# Altium footprint library Switches.PcbLib: 117 footprints (part 6 of 8) (continued)
## SW_LORLIN_CK_1-2-4-POLES [mm] "1 Pole 12 Ways, Or 2 Poles 6 Ways, Or 4 Poles 3 Ways, Rotary Switch, LORLIN CK Serie" (continued)
Mechanical 14:
  circle w0.1: c0,-9.5 r0.9
  circle w0.1: c0,-9.5 r1.1
  circle w0.1: c0,-9.5 r0.2
  circle w0.1: c0,-9.5 r0.1
  circle w0.1: c0,-9.5 r0.5
  circle w0.1: c0,-9.5 r1.3
  circle w0.1: c0,-9.5 r0.7
  circle w0.1: c0,-9.5 r0.3
  circle w0.1: c0,0 r3
  circle w0.1: c0,0 r4.8
  circle w0.1: c0,-9.5 r1.5
  circle w0.1: c0,0 r13.1
  circle w0.1: c-7.778,-7.778 r0.75
  circle w0.1: c-10.625,-2.847 r0.75
  circle w0.1: c-10.625,2.847 r0.75
  circle w0.1: c-7.778,7.778 r0.75
  circle w0.1: c-2.847,10.625 r0.75
  circle w0.1: c2.847,10.625 r0.75
  circle w0.1: c7.778,7.778 r0.75
  circle w0.1: c10.625,2.847 r0.75
  circle w0.1: c10.625,-2.847 r0.75
  circle w0.1: c7.778,-7.778 r0.75
  circle w0.1: c2.847,-10.625 r0.75
  circle w0.1: c-2.847,-10.625 r0.75
  circle w0.1: c-2.722,2.722 r0.75
  circle w0.1: c2.722,2.722 r0.75
  circle w0.1: c2.722,-2.722 r0.75
  circle w0.1: c-2.722,-2.722 r0.75
  circle w0.1: c0,-9.5 r1.5
  circle w0.1: c0,-9.5 r1.4
  circle w0.1: c0,-9.5 r1.2
  circle w0.1: c0,-9.5 r1
  circle w0.1: c0,-9.5 r0.8
  circle w0.1: c0,-9.5 r0.6
  circle w0.1: c0,-9.5 r0.4
  lines w0.1: -7.548,-10.707 ccw(c-6.249,-10.768) -5.552,-11.865 ; -7.5,10.741 cw(c-6.201,10.796) -5.499,11.89 ; -1.177,-8.57 cw(c0,0) 1.177,-8.57 ; 5.499,-11.89 ccw(c6.201,-10.796) 7.5,-10.741 ; 5.552,11.865 cw(c6.249,10.768) 7.548,10.707
  text "B" at -1.299,0.833 h1
  text "C" at 0.833,1.299 h1
  text "D" at 1.299,-0.833 h1
  text "A" at -0.833,-1.299 h1
  text "6" at -1.958,5.547 h1.5
  text "5" at -4.469,3.825 h1.5
  text "4" at -5.783,1.078 h1.5
  text "3" at -5.547,-1.958 h1.5
  text "2" at -3.825,-4.469 h1.5
  text "1" at -1.279,-5.742 h1.5
  text "12" at 2.245,-5.437 h1.5
  text "11" at 4.6,-3.666 h1.5
  text "10" at 5.831,-0.774 h1.5
  text "9" at 5.497,2.044 h1.5
  text "8" at 3.788,4.432 h1.5
  text "7" at 1.064,5.733 h1.5
3D body "SW_LORLIN_CK_1-2-4-POLES.stp": height 64.1, standoff -3.5, extent -13.1,-13.1 13.1,13.1

## SW_LORLIN_CK_3-POLES [mm] "3 Pole 4 Ways, Rotary Switch, LORLIN CK Serie"
height 68.1
pads (15):
  round 2 hole 1.5: 1(-2.847,-10.625) 2(-7.778,-7.778) 3(-10.625,-2.847) 4(-10.625,2.847) 5(-7.778,7.778) 6(-2.847,10.625) 7(2.847,10.625) 8(7.778,7.778) 9(10.625,2.847) 10(10.625,-2.847) 11(7.778,-7.778) 12(2.847,-10.625) A(-3.334,-1.925) B(0,3.85) C(3.334,-1.925)
Top Overlay:
  circle w0.2: c0,0 r13.1
  circle w0.2: c0,-9.5 r0.9
  circle w0.2: c0,-9.5 r1.1
  circle w0.2: c0,-9.5 r1.5
  circle w0.2: c0,-9.5 r0.1
  circle w0.2: c0,-9.5 r0.5
  circle w0.2: c0,-9.5 r1.3
  circle w0.2: c0,-9.5 r0.7
  circle w0.2: c0,-9.5 r0.3
  lines w0.2: -7.548,-10.707 ccw(c-6.249,-10.768) -5.552,-11.865 ; -7.5,10.741 cw(c-6.201,10.796) -5.499,11.89 ; -4.561,-1.495 cw(c0,0) -0.986,4.698 ; -3.576,-3.202 ccw(c0,0) 3.576,-3.202 ; -2.919,-0.693 cw(c0,0) -0.859,2.874 ; -2.06,-2.181 ccw(c0,0) 2.06,-2.181 ; -1.177,-8.57 cw(c0,0) 1.177,-8.57 ; 0.859,2.874 cw(c0,0) 2.919,-0.693 ; 0.986,4.698 cw(c0,0) 4.561,-1.495 ; 5.499,-11.89 ccw(c6.201,-10.796) 7.5,-10.741 ; 5.552,11.865 cw(c6.249,10.768) 7.548,10.707
  text "7" at 1.064,5.733 h1.5
  text "8" at 3.788,4.432 h1.5
  text "9" at 5.497,2.044 h1.5
  text "10" at 5.831,-0.774 h1.5
  text "11" at 4.6,-3.666 h1.5
  text "12" at 2.245,-5.437 h1.5
  text "1" at -1.279,-5.742 h1.5
  text "2" at -3.825,-4.469 h1.5
  text "3" at -5.547,-1.958 h1.5
  text "4" at -5.783,1.078 h1.5
  text "5" at -4.469,3.825 h1.5
  text "6" at -1.958,5.547 h1.5
  text "C" at 1.47,-0.468 h1
  text "B" at -0.33,1.507 h1
  text "A" at -1.141,-1.039 h1
Mechanical 8:
  lines w0.1: -11.591,-3.106 -10.625,-2.847 ; -11.591,3.106 -10.625,2.847 ; -10.884,-1.881 -10.625,-2.847 ; -10.884,1.881 -10.625,2.847 ; -10.366,-3.813 -10.625,-2.847 ; -10.366,3.813 -10.625,2.847 ; -9.659,-2.588 -10.625,-2.847 ; -9.659,2.588 -10.625,2.847 ; -8.485,-8.485 -7.778,-7.778 ; -8.485,-7.071 -7.778,-7.778 ; -8.485,7.071 -7.778,7.778 ; -8.485,8.485 -7.778,7.778 ; -7.071,-8.485 -7.778,-7.778 ; -7.071,-7.071 -7.778,-7.778 ; -7.071,7.071 -7.778,7.778 ; -7.071,8.485 -7.778,7.778 ; -4.2,-2.425 -3.334,-1.925 ; -3.834,-1.059 -3.334,-1.925 ; -3.813,-10.366 -2.847,-10.625 ; -3.813,10.366 -2.847,10.625 ; -3.106,-11.591 -2.847,-10.625 ; -3.106,11.591 -2.847,10.625 ; -2.834,-2.791 -3.334,-1.925 ; -2.588,-9.659 -2.847,-10.625 ; -2.588,9.659 -2.847,10.625 ; -2.468,-1.425 -3.334,-1.925 ; -1.881,-10.884 -2.847,-10.625 ; -1.881,10.884 -2.847,10.625 ; -1,0 0,0 ; -1,3.85 0,3.85 ; 0,-1 0,0 ; 0,1 0,0 ; 0,2.85 0,3.85 ; 0,4.85 0,3.85 ; 1,0 0,0 ; 1,3.85 0,3.85 ; 1.881,-10.884 2.847,-10.625 ; 1.881,10.884 2.847,10.625 ; 2.468,-1.425 3.334,-1.925 ; 2.588,-9.659 2.847,-10.625 ; 2.588,9.659 2.847,10.625 ; 2.834,-2.791 3.334,-1.925 ; 3.106,-11.591 2.847,-10.625 ; 3.106,11.591 2.847,10.625 ; 3.813,-10.366 2.847,-10.625 ; 3.813,10.366 2.847,10.625 ; 3.834,-1.059 3.334,-1.925 ; 4.2,-2.425 3.334,-1.925 ; 7.071,-8.485 7.778,-7.778 ; 7.071,-7.071 7.778,-7.778 ; 7.071,7.071 7.778,7.778 ; 7.071,8.485 7.778,7.778 ; 8.485,-8.485 7.778,-7.778 ; 8.485,-7.071 7.778,-7.778 ; 8.485,7.071 7.778,7.778 ; 8.485,8.485 7.778,7.778 ; 9.659,-2.588 10.625,-2.847 ; 9.659,2.588 10.625,2.847 ; 10.366,-3.813 10.625,-2.847 ; 10.366,3.813 10.625,2.847 ; 10.884,-1.881 10.625,-2.847 ; 10.884,1.881 10.625,2.847 ; 11.591,-3.106 10.625,-2.847 ; 11.591,3.106 10.625,2.847
Mechanical 14:
  circle w0.1: c0,0 r13.1
  circle w0.1: c-7.778,-7.778 r0.75
  circle w0.1: c-10.625,-2.847 r0.75
  circle w0.1: c-10.625,2.847 r0.75
  circle w0.1: c-7.778,7.778 r0.75
  circle w0.1: c-2.847,10.625 r0.75
  circle w0.1: c2.847,10.625 r0.75
  circle w0.1: c7.778,7.778 r0.75
  circle w0.1: c10.625,2.847 r0.75
  circle w0.1: c10.625,-2.847 r0.75
  circle w0.1: c7.778,-7.778 r0.75
  circle w0.1: c2.847,-10.625 r0.75
  circle w0.1: c-2.847,-10.625 r0.75
  circle w0.1: c0,0 r3
  circle w0.1: c0,0 r4.8
  circle w0.1: c0,-9.5 r0.9
  circle w0.1: c0,-9.5 r1.1
  circle w0.1: c0,-9.5 r0.2
  circle w0.1: c0,-9.5 r0.1
  circle w0.1: c0,-9.5 r0.5
  circle w0.1: c0,-9.5 r1.3
  circle w0.1: c0,-9.5 r0.7
  circle w0.1: c0,-9.5 r0.3
  circle w0.1: c0,-9.5 r1.5
  circle w0.1: c0,-9.5 r1.5
  circle w0.1: c0,-9.5 r1.4
  circle w0.1: c0,-9.5 r1.2
  circle w0.1: c0,-9.5 r1
  circle w0.1: c0,-9.5 r0.8
  circle w0.1: c0,-9.5 r0.6
  circle w0.1: c0,-9.5 r0.4
  lines w0.1: -7.548,-10.707 ccw(c-6.249,-10.768) -5.552,-11.865 ; -7.5,10.741 cw(c-6.201,10.796) -5.499,11.89 ; -1.177,-8.57 cw(c0,0) 1.177,-8.57 ; 5.499,-11.89 ccw(c6.201,-10.796) 7.5,-10.741 ; 5.552,11.865 cw(c6.249,10.768) 7.548,10.707
  text "7" at 1.064,5.733 h1.5
  text "8" at 3.788,4.432 h1.5
  text "9" at 5.497,2.044 h1.5
  text "10" at 5.831,-0.774 h1.5
  text "11" at 4.6,-3.666 h1.5
  text "12" at 2.245,-5.437 h1.5
  text "1" at -1.279,-5.742 h1.5
  text "2" at -3.825,-4.469 h1.5
  text "3" at -5.547,-1.958 h1.5
  text "4" at -5.783,1.078 h1.5
  text "5" at -4.469,3.825 h1.5
  text "6" at -1.958,5.547 h1.5
  text "C" at 1.47,-0.468 h1
  text "B" at -0.33,1.507 h1
  text "A" at -1.141,-1.039 h1
3D body "SW_LORLIN_CK_3-POLES.stp": height 64.1, standoff -3.5, extent -13.1,-13.1 13.1,13.1

## SW_MENTOR_1850 [mm] "SPDT Switch - PCB Edge Mounting - MENTOR_1850"
height 9.95
pads (4):
  round 1.35 hole 0.8: 1(2.54,-1.25) 2(7.62,-1.25) 3(5.08,-1.25)
  round 0.5 hole 1.2 unplated mask+0.35: 4(0,0)
Top Overlay:
  lines w0.2: -8.967,-1 -8.6,-1 ; -8.967,1 -8.6,1 ; -6.84,-1.9 -8.1,-1.9 ; -6.84,1.9 -8.1,1.9 ; -8.1,-1.9 -8.6,-1.4 -8.6,1.4 -8.1,1.9 ; -8.1,-1.9 -8.1,1.9 ; -14.1,-1.5 -14.1,1.5 -8.967,1.5 -8.967,-1.5 -14.1,-1.5 ; -6.84,-2.5 -0.525,-2.5 -0.525,-1.95 0.525,-1.95 0.525,-2.5 8.66,-2.5 8.66,2.5 0.5,2.5 0.5,3 -0.5,3 -0.5,2.5 -6.84,2.5 -6.84,-2.5
  text "2" at 7.239,0 h1
  text "1" at 2.413,0 h1
  text "3" at 4.699,0 h1
Mechanical 8:
  circle w0.1: c0,0 r0.5
  lines w0.1: -1,0 0,0 0,-1 ; 1.54,-1.25 2.54,-1.25 2.54,-2.25 ; 4.08,-1.25 5.08,-1.25 5.08,-2.25 ; 6.62,-1.25 7.62,-1.25 7.62,-2.25 ; 2.24,-1.45 2.24,-1.05 2.84,-1.05 2.84,-1.45 2.24,-1.45 ; 4.78,-1.45 4.78,-1.05 5.38,-1.05 5.38,-1.45 4.78,-1.45 ; 7.32,-1.45 7.32,-1.05 7.92,-1.05 7.92,-1.45 7.32,-1.45
Mechanical 14:
  lines w0.1: -8.967,-1 -8.6,-1 ; -8.967,1 -8.6,1 ; -6.84,-1.9 -8.1,-1.9 ; -6.84,1.9 -8.1,1.9 ; -8.1,-1.9 -8.6,-1.4 -8.6,1.4 -8.1,1.9 ; -8.1,-1.9 -8.1,1.9 ; -14.1,-1.5 -14.1,1.5 -8.967,1.5 -8.967,-1.5 -14.1,-1.5 ; -6.84,-2.5 -0.525,-2.5 -0.525,-1.95 0.525,-1.95 0.525,-2.5 8.66,-2.5 8.66,2.5 0.5,2.5 0.5,3 -0.5,3 -0.5,2.5 -6.84,2.5 -6.84,-2.5
3D body "SW_MENTOR_1850.stp": height 9.95, standoff -3.45, extent -13.653,-2.5 8.66,3

## SW_MULTICOMP_4US1R202M2RN [mm] "Pitch 2.45mm, Body 7.5x5mm, SPDT Switch, On-On, Lever"
height 10.8
pads (5):
  round 1.1 hole 0.6: 1(1.27,2.54) 3(1.27,-2.54) 4(-1.27,2.54) 5(-1.27,0) 6(-1.27,-2.54)
Top Overlay:
  lines w0.2: -2.15,0 -2.15,1.3 -1.9,1.3 ; -1.9,-3.047 -1.9,-3.5 1.9,-3.5 1.9,-3.047 ; -1.9,-2.033 -1.9,-0.507 ; -1.9,0.507 -1.9,2.033 ; -1.9,3.047 -1.9,3.5 1.9,3.5 1.9,3.047 ; 0,-3.5 0,-3.75 1.3,-3.75 1.3,-3.5 ; 0,3.5 0,3.75 1.3,3.75 1.3,3.5 ; 1.9,-2.033 1.9,2.033 ; 1.9,0 2.15,0 2.15,1.3 1.9,1.3
Mechanical 8:
  circle w0.1: c-1.27,-2.54 r0.3
  circle w0.1: c-1.27,0 r0.3
  circle w0.1: c-1.27,2.54 r0.3
  circle w0.1: c1.27,2.54 r0.3
  circle w0.1: c1.27,-2.54 r0.3
  lines w0.1: -1.57,-2.54 -1.27,-2.54 -1.27,-2.84 ; -1.57,0 -1.27,0 -1.27,-0.3 ; -1.57,2.54 -1.27,2.54 -1.27,2.24 ; 1.27,-2.84 1.27,-2.54 1.57,-2.54 ; 1.27,2.24 1.27,2.54 1.57,2.54
  text "5" at -0.52,-0.5 h1
  text "4" at -0.52,2.04 h1
  text "6" at -0.52,-3.04 h1
Mechanical 14:
  lines w0.1: -1.9,0 -2.15,0 -2.15,1.3 -1.9,1.3 ; -1.3,-2.538 1.3,-2.538 ; -1.3,-0.368 1.3,-0.368 ; -1.3,1.685 1.3,1.685 ; -1.3,1.996 1.3,1.996 ; 0,-3.5 0,-3.75 1.3,-3.75 1.3,-3.5 ; 0,3.5 0,3.75 1.3,3.75 1.3,3.5 ; 1.9,0 2.15,0 2.15,1.3 1.9,1.3 ; -1.9,-3.5 1.9,-3.5 1.9,3.5 -1.9,3.5 -1.9,-3.5 ; -1.3,-2.9 -1.3,2.9 1.3,2.9 1.3,-2.9 -1.3,-2.9
3D body "SW_MULTICOMP_4US1R202M2RN.stp": height 10.65, standoff -2.6, extent -2.15,-3.75 2.15,3.75

## SW_MULTICOMP_MCMT5-F-V [mm] "Navigation Switch - Multidirectional 5 Way (4-directional and center push)"
height 4.5
pads (10):
  rect 3x1 smd: 1(-3.5,1.425) 2(-3.5,0) 3(-3.5,-1.425) 4(3.5,1.425) 5(3.5,0) 6(3.5,-1.425)
  rect 2x1.8 smd: 7(0,4.05) 8(0,-4.05)
  round 0.5 hole 1.1 unplated mask+0.3: 9(0,-1.9)
  round 0.5 hole 0.8 unplated mask+0.15: 10(0,1.9)
Top Overlay:
  lines w0.2: -3.452,-2.325 -1.986,-3.85 -1.4,-3.85 ; -3.452,2.325 -1.986,3.85 -1.4,3.85 ; -2.75,-2.35 -2.75,-2.65 ; -2.75,2.35 -2.75,2.65 ; -2.45,-2.65 -2.75,-2.65 ; -2.45,2.65 -2.75,2.65 ; -2.3,-2.2 -2.75,-2.65 ; -2.3,2.2 -2.75,2.65 ; -0.554,-1.394 cw(c0,0) -0.394,1.447 ; 0.394,1.447 cw(c0,0) 0.554,-1.394 ; 1.4,-3.85 1.986,-3.85 3.452,-2.325 ; 1.4,3.85 1.986,3.85 3.452,2.325 ; 2.3,2.3 2.75,2.75 ; 2.4,-2.1 2.85,-2.55 ; 2.45,2.75 2.75,2.75 ; 2.55,-2.55 2.85,-2.55 ; 2.75,2.45 2.75,2.75 ; 2.85,-2.25 2.85,-2.55 ; -1.025,-0.354 cw(c-0.672,0) -1.025,0.354 -0.354,1.025 cw(c0,0.672) 0.354,1.025 1.025,0.354 cw(c0.672,0) 1.025,-0.354 0.354,-1.025 cw(c0,-0.672) -0.354,-1.025 -1.025,-0.354
  text "C" at -2.018,-3.06 h1
  text "A" at -2.018,2.24 h1
  text "D" at 1.382,-3.06 h1
  text "B" at 1.4,2.3 h1
  text "3" at -4.607,-3.278 h1
  text "6" at 3.993,-3.311 h1
  text "4" at 4,2.3 h1
  text "1" at -4.5,2.3 h1
Mechanical 8:
  lines w0.1: -4.5,-1.425 -3.5,-1.425 ; -4.5,0 -3.5,0 ; -4.5,1.425 -3.5,1.425 ; -3.5,-2.425 -3.5,-1.425 ; -3.5,-1 -3.5,0 ; -3.5,-0.425 -3.5,-1.425 ; -3.5,0.425 -3.5,1.425 ; -3.5,1 -3.5,0 ; -3.5,2.425 -3.5,1.425 ; -2.5,-1.425 -3.5,-1.425 ; -2.5,0 -3.5,0 ; -2.5,1.425 -3.5,1.425 ; -1,-4.05 0,-4.05 ; -1,-1.9 0,-1.9 ; -1,0 0,0 ; -1,1.9 0,1.9 ; -1,3.65 1,3.65 ; -1,4.05 0,4.05 ; 0,-5.05 0,-4.05 ; 0,-3.05 0,-4.05 ; 0,-2.9 0,-1.9 ; 0,-1 0,0 ; 0,-0.9 0,-1.9 ; 0,0.9 0,1.9 ; 0,1 0,0 ; 0,2.9 0,1.9 ; 0,3.05 0,4.05 ; 0,5.05 0,4.05 ; 1,-4.05 0,-4.05 ; 1,-1.9 0,-1.9 ; 1,0 0,0 ; 1,1.9 0,1.9 ; 1,4.05 0,4.05 ; 2.5,-1.425 3.5,-1.425 ; 2.5,0 3.5,0 ; 2.5,1.425 3.5,1.425 ; 3.5,-2.425 3.5,-1.425 ; 3.5,-1 3.5,0 ; 3.5,-0.425 3.5,-1.425 ; 3.5,0.425 3.5,1.425 ; 3.5,1 3.5,0 ; 3.5,2.425 3.5,1.425 ; 4.5,-1.425 3.5,-1.425 ; 4.5,0 3.5,0 ; 4.5,1.425 3.5,1.425 ; -5,-1.925 -5,-0.925 -2,-0.925 -2,-1.925 -5,-1.925 ; -5,-0.5 -5,0.5 -2,0.5 -2,-0.5 -5,-0.5 ; -5,0.925 -5,1.925 -2,1.925 -2,0.925 -5,0.925 ; -1,-4.95 1,-4.95 1,-3.15 -1,-3.15 -1,-4.95 ; -1,3.15 1,3.15 1,4.95 -1,4.95 -1,3.15 ; 2,-1.925 2,-0.925 5,-0.925 5,-1.925 2,-1.925 ; 2,-0.5 2,0.5 5,0.5 5,-0.5 2,-0.5 ; 2,0.925 2,1.925 5,1.925 5,0.925 2,0.925
Mechanical 14:
  circle w0.1: c0,0 r2
  circle w0.1: c0,-3.15 r0.5
  circle w0.1: c3,0 r0.5
  circle w0.1: c0,3.15 r0.5
  circle w0.1: c-3,0 r0.5
  circle w0.1: c0,0 r1.5
  lines w0.1: -3.7,-1.775 -4.5,-1.775 -4.5,-1.075 -3.7,-1.075 ; -3.7,-0.35 -4.5,-0.35 -4.5,0.35 -3.7,0.35 ; -3.7,1.075 -4.5,1.075 -4.5,1.775 -3.7,1.775 ; -2.75,-2.35 -2.75,-2.65 ; -2.75,2.35 -2.75,2.65 ; -2.45,-2.65 -2.75,-2.65 ; -2.45,2.65 -2.75,2.65 ; -2.3,-2.2 -2.75,-2.65 ; -2.3,2.2 -2.75,2.65 ; -0.8,-3.85 -0.8,-4.45 0.8,-4.45 0.8,-3.85 ; -0.8,3.85 -0.8,4.45 0.8,4.45 0.8,3.85 ; 2.3,2.3 2.75,2.75 ; 2.4,-2.1 2.85,-2.55 ; 2.45,2.75 2.75,2.75 ; 2.55,-2.55 2.85,-2.55 ; 2.75,2.45 2.75,2.75 ; 2.85,-2.25 2.85,-2.55 ; 3.7,-1.775 4.5,-1.775 4.5,-1.075 3.7,-1.075 ; 3.7,-0.35 4.5,-0.35 4.5,0.35 3.7,0.35 ; 3.7,1.075 4.5,1.075 4.5,1.775 3.7,1.775 ; -3.7,-2.067 -1.986,-3.85 1.986,-3.85 3.7,-2.067 3.7,2.067 1.986,3.85 -1.986,3.85 -3.7,2.067 -3.7,-2.067 ; -1.025,-0.354 cw(c-0.672,0) -1.025,0.354 -0.354,1.025 cw(c0,0.672) 0.354,1.025 1.025,0.354 cw(c0.672,0) 1.025,-0.354 0.354,-1.025 cw(c0,-0.672) -0.354,-1.025 -1.025,-0.354
  text "C" at -2.018,-3.06 h1
  text "A" at -2.018,2.24 h1
  text "D" at 1.382,-3.06 h1
  text "B" at 1.4,2.3 h1
  text "3" at -4.607,-3.278 h1
  text "6" at 3.993,-3.311 h1
  text "4" at 4,2.3 h1
  text "1" at -4.5,2.3 h1
3D body "SW_MULTICOMP_MCMT5-F-V.stp": height 4.5, standoff -0.5, extent -4.5,-4.45 4.5,4.45

## SW_NIKKAI_G12JHD [mm] "Body 7x4.5mm, Toggle SPDT Switch - Right Angled PCB Mounting With Clear Toggle Amber Led, NIKKAI G Series"
height 4.9
pads (8):
  round 1.2 hole 0.7: 1(1.27,2.54) 2(1.27,0) 3(1.27,-2.54) 4(-1.27,2.54) 5(-1.27,0) 6(-1.27,-2.54) 7(-6.35,2.54) 8(-6.35,-2.54)
Top Overlay:
  lines w0.2: -8.95,-0.876 -12.552,0.022 ; -8.95,0.876 -12.14,1.671 ; -7.35,-2 -8.95,-2 -8.95,2 -7.35,2 ; -6.55,-1.6 -6.55,1.6 ; -6.15,-1.6 -6.15,1.6 ; -2.85,-2.74 -2.045,-2.74 ; -2.85,-2.34 -2.045,-2.34 ; -2.85,-0.2 -2.045,-0.2 ; -2.85,0.196 -2.046,0.196 ; -2.85,2.34 -2.045,2.34 ; -2.85,2.74 -2.045,2.74 ; -0.495,-2.74 0.495,-2.74 ; -0.495,-2.34 0.495,-2.34 ; -0.495,-0.2 0.495,-0.2 ; -0.495,2.34 0.495,2.34 ; -0.495,2.74 0.495,2.74 ; -0.494,0.196 0.494,0.196 ; -12.552,0.022 cw(c-12.479,0.313) -12.77,0.386 -12.504,1.453 cw(c-12.213,1.38) -12.14,1.671 ; -12.552,0.022 -12.14,1.671 ; -7.35,-3.5 -6.55,-3.5 -6.55,-3.9 -6.15,-3.9 -6.15,-3.5 -2.85,-3.5 -2.85,3.5 -6.15,3.5 -6.15,3.9 -6.55,3.9 -6.55,3.5 -7.35,3.5 -7.35,-3.5
Mechanical 8:
  lines w0.1: -7.35,-2.54 -6.35,-2.54 ; -7.35,2.54 -6.35,2.54 ; -6.35,-3.54 -6.35,-2.54 ; -6.35,-1.54 -6.35,-2.54 ; -6.35,1.54 -6.35,2.54 ; -6.35,3.54 -6.35,2.54 ; -5.35,-2.54 -6.35,-2.54 ; -5.35,2.54 -6.35,2.54 ; -2.27,-2.54 -1.27,-2.54 ; -2.27,0 -1.27,0 ; -2.27,2.54 -1.27,2.54 ; -1.27,-3.54 -1.27,-2.54 ; -1.27,-1.54 -1.27,-2.54 ; -1.27,-1 -1.27,0 ; -1.27,1 -1.27,0 ; -1.27,1.54 -1.27,2.54 ; -1.27,3.54 -1.27,2.54 ; -0.27,-2.54 -1.27,-2.54 ; -0.27,0 -1.27,0 ; -0.27,2.54 -1.27,2.54 ; 0.27,-2.54 1.27,-2.54 ; 0.27,0 1.27,0 ; 0.27,2.54 1.27,2.54 ; 1.27,-3.54 1.27,-2.54 ; 1.27,-1.54 1.27,-2.54 ; 1.27,-1 1.27,0 ; 1.27,1 1.27,0 ; 1.27,1.54 1.27,2.54 ; 1.27,3.54 1.27,2.54 ; 2.27,-2.54 1.27,-2.54 ; 2.27,0 1.27,0 ; 2.27,2.54 1.27,2.54
Mechanical 14:
  lines w0.1: -8.95,-0.876 -12.552,0.022 ; -8.95,0.876 -12.14,1.671 ; -7.35,-2 -8.95,-2 -8.95,2 -7.35,2 ; -6.55,-3.5 -7.35,-3.5 -7.35,3.5 -6.55,3.5 ; -6.15,-3.5 -2.85,-3.5 -2.85,3.5 -6.15,3.5 ; -2.85,-2.74 1.27,-2.74 ccw(c1.27,-2.54) 1.27,-2.34 -2.85,-2.34 ; -2.85,-0.2 1.27,-0.2 ccw(c1.27,0) 1.27,0.2 ; -2.85,0.196 1.27,0.196 ; -2.85,2.34 1.27,2.34 ccw(c1.27,2.54) 1.27,2.74 -2.85,2.74 ; -12.552,0.022 cw(c-12.479,0.313) -12.77,0.386 -12.504,1.453 cw(c-12.213,1.38) -12.14,1.671 ; -12.552,0.022 -12.14,1.671 ; -6.55,-3.9 -6.15,-3.9 -6.15,3.9 -6.55,3.9 -6.55,-3.9
3D body "SW_NIKKAI_G12JHD.stp": height 4.9, standoff -3.1, extent -12.779,-3.9 1.47,3.9

## SW_NKK_B12JJPC [mm] "Body 8.8x8.8mm, Straight PCB Mounting  Subminiature Fully Red Illuminated Toggle SPDT Switch, NKK B Series"
height 19.4
pads (6):
  round 1.5 hole 0.8: 1(2.54,2.54) 2(2.54,0) 3(2.54,-2.54) 4(-2.54,2.54) 5(-2.54,0) 6(-2.54,-2.54)
Top Overlay:
  circle w0.2: c0,1.314 r0.953
  lines w0.2: -4.394,-3.378 -3.988,-3.378 ; -4.394,3.378 -3.988,3.378 ; -3.988,-2.997 -3.54,-2.997 ; -3.988,2.997 -3.54,2.997 ; -3.378,-4.394 -3.378,-3.988 ; -3.378,3.988 -3.378,4.394 ; -1.54,-2.997 1.54,-2.997 ; -1.54,2.997 1.54,2.997 ; -1.467,-2.299 ccw(c0,0) 1.467,-2.299 ; -1.467,2.299 cw(c0,0) 1.467,2.299 ; -1.443,-2.627 ccw(c0,0) 1.443,-2.627 ; -1.443,2.627 cw(c0,0) 1.443,2.627 ; -0.953,0.84 ccw(c0,0) 0.953,0.84 ; -0.953,1.314 -0.953,-0.286 ccw(c0,-0.309) 0.952,-0.286 0.953,1.314 ; -0.952,1.349 ccw(c0,0) 0.952,1.349 ; 3.378,-4.394 3.378,-3.988 ; 3.378,3.988 3.378,4.394 ; 3.54,-2.997 3.988,-2.997 ; 3.54,2.997 3.988,2.997 ; 3.988,-3.378 4.394,-3.378 ; 3.988,3.378 4.394,3.378 ; -3.988,-3.988 3.988,-3.988 ; -3.988,-3.988 -3.988,3.988 ; -3.988,-3.988 -3.734,-3.734 ; -3.988,3.988 3.988,3.988 3.988,-3.988 ; -3.988,3.988 -3.734,3.734 ; -3.734,-3.734 3.734,-3.734 ; -3.734,-3.734 -3.734,3.734 ; -3.734,3.734 3.734,3.734 3.734,-3.734 ; 3.734,-3.734 3.988,-3.988 ; -4.4,-4.146 ccw(c-4.146,-4.146) -4.146,-4.4 4.146,-4.4 ccw(c4.146,-4.146) 4.4,-4.146 4.4,4.146 ccw(c4.146,4.146) 4.146,4.4 -4.146,4.4 ccw(c-4.146,4.146) -4.4,4.146 -4.4,-4.146 ; -0.2,-2.7 0.2,-2.7 0.2,-2.3 -0.2,-2.3 -0.2,-2.7
Mechanical 8:
  lines w0.1: -3.04,-2.54 -2.54,-2.54 ; -3.04,0 -2.54,0 ; -3.04,2.54 -2.54,2.54 ; -2.54,-3.04 -2.54,-2.54 ; -2.54,-2.04 -2.54,-2.54 ; -2.54,-0.5 -2.54,0 ; -2.54,0.5 -2.54,0 ; -2.54,2.04 -2.54,2.54 ; -2.54,3.04 -2.54,2.54 ; -2.04,-2.54 -2.54,-2.54 ; -2.04,0 -2.54,0 ; -2.04,2.54 -2.54,2.54 ; -0.5,0 0,0 ; 0,-0.5 0,0 ; 0,0.5 0,0 ; 0.5,0 0,0 ; 2.04,-2.54 2.54,-2.54 ; 2.04,0 2.54,0 ; 2.04,2.54 2.54,2.54 ; 2.54,-3.04 2.54,-2.54 ; 2.54,-2.04 2.54,-2.54 ; 2.54,-0.5 2.54,0 ; 2.54,0.5 2.54,0 ; 2.54,2.04 2.54,2.54 ; 2.54,3.04 2.54,2.54 ; 3.04,-2.54 2.54,-2.54 ; 3.04,0 2.54,0 ; 3.04,2.54 2.54,2.54
Mechanical 14:
  circle w0.1: c0,0 r2.997
  circle w0.1: c0,1.314 r0.953
  circle w0.1: c0,0 r2.727
  lines w0.1: -4.394,-3.378 -3.988,-3.378 ; -4.394,3.378 -3.988,3.378 ; -3.988,-2.997 3.988,-2.997 ; -3.988,2.997 3.988,2.997 ; -3.378,-4.394 -3.378,-3.988 ; -3.378,3.988 -3.378,4.394 ; -0.953,0.84 ccw(c0,0) 0.953,0.84 ; -0.953,1.314 -0.953,-0.286 ccw(c0,-0.309) 0.952,-0.286 0.953,1.314 ; -0.952,1.349 ccw(c0,0) 0.952,1.349 ; 3.378,-4.394 3.378,-3.988 ; 3.378,3.988 3.378,4.394 ; 3.988,-3.378 4.394,-3.378 ; 3.988,3.378 4.394,3.378 ; -3.988,-3.988 3.988,-3.988 ; -3.988,-3.988 -3.988,3.988 ; -3.988,-3.988 -3.734,-3.734 ; -3.988,3.988 3.988,3.988 ; -3.988,3.988 -3.734,3.734 ; -3.734,-3.734 3.734,-3.734 ; -3.734,-3.734 -3.734,3.734 ; -3.734,3.734 3.734,3.734 ; 3.734,-3.734 3.734,3.734 ; 3.734,-3.734 3.988,-3.988 ; 3.734,3.734 3.988,3.988 ; 3.988,-3.988 3.988,3.988 ; -4.4,-4.146 ccw(c-4.146,-4.146) -4.146,-4.4 4.146,-4.4 ccw(c4.146,-4.146) 4.4,-4.146 4.4,4.146 ccw(c4.146,4.146) 4.146,4.4 -4.146,4.4 ccw(c-4.146,4.146) -4.4,4.146 -4.4,-4.146 ; -0.2,-2.7 -0.2,-2.3 0.2,-2.3 0.2,-2.7 -0.2,-2.7
3D body "SW_NKK_B12JJPC.stp": height 19.26, standoff -3.1, extent -4.394,-4.394 4.394,4.394

## SW_NKK_B12JJVC [mm] "Body 8.8x8.8mm,Right Angle PCB Mounting , Vertical Actuator,  Subminiature Fully Red Illuminated Toggle SPDT Switch, NKK B Series"
height 8.8
pads (8):
  round 1.5 hole 0.8: 1(2.54,-2.54) 2(0,-2.54) 3(-2.54,-2.54) 4(2.54,2.54) 5(0,2.54) 6(-2.54,2.54) 7(-7.62,-2.54) 8(-7.62,2.54)
Top Overlay:
  lines w0.2: -21.614,0.952 -16.408,0.952 ; -21.599,0.952 ccw(c-21.618,0) -21.618,-0.953 -16.408,-0.953 ; -13.716,-2.997 -16.139,-2.997 ; -13.716,2.997 -16.139,2.997 ; -13.31,-3.302 -13.716,-3.302 -13.716,3.302 -13.31,3.302 ; -12.903,-3.988 -12.903,3.988 ; -8.484,-4.394 -8.484,-3.378 -8.479,-3.378 ; -8.484,4.394 -8.484,3.378 -8.479,3.378 ; -7.214,-1.411 -7.214,1.411 ; -3.861,-2.845 -3.701,-2.845 ; -3.861,-2.235 -3.701,-2.235 ; -3.861,2.235 -3.701,2.235 ; -3.861,2.845 -3.701,2.845 ; -1.379,-2.845 -1.161,-2.845 ; -1.379,-2.235 -1.161,-2.235 ; -1.379,2.235 -1.161,2.235 ; -1.379,2.845 -1.161,2.845 ; 1.161,-2.845 1.379,-2.845 ; 1.161,-2.235 1.379,-2.235 ; 1.161,2.235 1.379,2.235 ; 1.161,2.845 1.379,2.845 ; -16.139,-2.997 -16.139,2.997 ; -16.139,-2.997 -16.408,-2.725 -16.408,2.728 -16.139,2.997 ; -13.31,-3.988 -12.141,-3.988 -12.141,-4.394 -3.073,-4.394 -3.073,-3.607 -3.861,-3.607 -3.861,3.607 -3.073,3.607 -3.073,4.394 -12.136,4.394 -12.136,3.988 -13.31,3.988 -13.31,-3.988
Mechanical 8:
  lines w0.1: -8.12,-2.54 -7.62,-2.54 ; -8.12,2.54 -7.62,2.54 ; -7.62,-3.04 -7.62,-2.54 ; -7.62,-2.04 -7.62,-2.54 ; -7.62,2.04 -7.62,2.54 ; -7.62,3.04 -7.62,2.54 ; -7.12,-2.54 -7.62,-2.54 ; -7.12,2.54 -7.62,2.54 ; -3.04,-2.54 -2.54,-2.54 ; -3.04,2.54 -2.54,2.54 ; -2.54,-3.04 -2.54,-2.54 ; -2.54,-2.04 -2.54,-2.54 ; -2.54,2.04 -2.54,2.54 ; -2.54,3.04 -2.54,2.54 ; -2.04,-2.54 -2.54,-2.54 ; -2.04,2.54 -2.54,2.54 ; -0.5,-2.54 0,-2.54 ; -0.5,0 0,0 ; -0.5,2.54 0,2.54 ; 0,-3.04 0,-2.54 ; 0,-2.04 0,-2.54 ; 0,-0.5 0,0 ; 0,0.5 0,0 ; 0,2.04 0,2.54 ; 0,3.04 0,2.54 ; 0.5,-2.54 0,-2.54 ; 0.5,0 0,0 ; 0.5,2.54 0,2.54 ; 2.04,-2.54 2.54,-2.54 ; 2.04,2.54 2.54,2.54 ; 2.54,-3.04 2.54,-2.54 ; 2.54,-2.04 2.54,-2.54 ; 2.54,2.04 2.54,2.54 ; 2.54,3.04 2.54,2.54 ; 3.04,-2.54 2.54,-2.54 ; 3.04,2.54 2.54,2.54
Mechanical 14:
  lines w0.1: -21.614,0.952 -16.408,0.952 ; -21.599,0.952 ccw(c-21.618,0) -21.618,-0.953 -16.408,-0.953 ; -13.716,-2.997 -16.139,-2.997 ; -13.716,2.997 -16.139,2.997 ; -13.31,-3.302 -13.716,-3.302 -13.716,3.302 -13.31,3.302 ; -12.903,-3.988 -12.903,3.988 ; -8.484,-4.394 -8.484,-3.378 -7.214,-3.378 -7.214,3.378 -8.484,3.378 -8.484,4.394 ; -3.861,-2.845 2.54,-2.845 ccw(c2.54,-2.54) 2.54,-2.235 -3.861,-2.235 ; -3.861,2.235 2.54,2.235 ccw(c2.54,2.54) 2.54,2.845 -3.861,2.845 ; -16.139,-2.997 -16.139,2.997 ; -16.139,-2.997 -16.408,-2.725 -16.408,2.728 -16.139,2.997 ; -13.31,-3.988 -12.141,-3.988 -12.141,-4.394 -3.073,-4.394 -3.073,-3.607 -3.861,-3.607 -3.861,3.607 -3.073,3.607 -3.073,4.394 -12.136,4.394 -12.136,3.988 -13.31,3.988 -13.31,-3.988
3D body "SW_NKK_B12JJVC.stp": height 8.79, standoff -4.09, extent -22.57,-4.394 2.845,4.394

## SW_OMRON_A6DR-4100 [mm] "Pitch 2.54mm, Body 12.2x8.9mm, 4 Ways SPST Sealed Piano DIP Switch, OMRON A6DR"
height 7.6
pads (8):
  round 1.5 hole 0.8: 1(-3.81,3.81) 2(-3.81,1.27) 3(-3.81,-1.27) 4(-3.81,-3.81) 5(3.81,-3.81) 6(3.81,-1.27) 7(3.81,1.27) 8(3.81,3.81)
Top Overlay:
  lines w0.2: -4.635,-4.46 -6.3,-4.46 -6.3,-3.16 -4.635,-3.16 ; -4.635,-1.92 -6.3,-1.92 -6.3,-0.62 -4.635,-0.62 ; -4.635,0.62 -6.3,0.62 -6.3,1.92 -4.635,1.92 ; -4.635,3.16 -6.3,3.16 -6.3,4.46 -4.635,4.46 ; -4.45,-4.642 -4.45,-6.1 4.45,-6.1 4.45,-4.642 ; -4.45,-2.978 -4.45,-2.102 ; -4.45,-0.438 -4.45,0.438 ; -4.45,2.102 -4.45,2.978 ; -4.45,4.642 -4.45,6.1 4.45,6.1 4.45,4.642 ; 4.45,-2.978 4.45,-2.102 ; 4.45,-0.438 4.45,0.438 ; 4.45,2.102 4.45,2.978 ; -1.35,-3.5 1.35,-3.5 1.35,3.5 -1.35,3.5 -1.35,-3.5
  text "4" at -6,-5.025 h1
  text "1" at -6.075,5.425 h1
Mechanical 8:
  lines w0.1: -4.31,-3.81 -3.81,-3.81 ; -4.31,-1.27 -3.81,-1.27 ; -4.31,1.27 -3.81,1.27 ; -4.31,3.81 -3.81,3.81 ; -3.81,-4.31 -3.81,-3.81 ; -3.81,-3.31 -3.81,-3.81 ; -3.81,-1.77 -3.81,-1.27 ; -3.81,-0.77 -3.81,-1.27 ; -3.81,0.77 -3.81,1.27 ; -3.81,1.77 -3.81,1.27 ; -3.81,3.31 -3.81,3.81 ; -3.81,4.31 -3.81,3.81 ; -3.31,-3.81 -3.81,-3.81 ; -3.31,-1.27 -3.81,-1.27 ; -3.31,1.27 -3.81,1.27 ; -3.31,3.81 -3.81,3.81 ; -0.5,0 0,0 ; 0,-0.5 0,0 ; 0,0.5 0,0 ; 0.5,0 0,0 ; 3.31,-3.81 3.81,-3.81 ; 3.31,-1.27 3.81,-1.27 ; 3.31,1.27 3.81,1.27 ; 3.31,3.81 3.81,3.81 ; 3.81,-4.31 3.81,-3.81 ; 3.81,-3.31 3.81,-3.81 ; 3.81,-1.77 3.81,-1.27 ; 3.81,-0.77 3.81,-1.27 ; 3.81,0.77 3.81,1.27 ; 3.81,1.77 3.81,1.27 ; 3.81,3.31 3.81,3.81 ; 3.81,4.31 3.81,3.81 ; 4.31,-3.81 3.81,-3.81 ; 4.31,-1.27 3.81,-1.27 ; 4.31,1.27 3.81,1.27 ; 4.31,3.81 3.81,3.81
Mechanical 14:
  lines w0.1: -4.45,-4.46 -4.45,-6.1 4.45,-6.1 4.45,6.1 -4.45,6.1 -4.45,4.46 ; -4.45,-3.16 -4.45,-1.92 ; -4.45,-0.62 -4.45,0.62 ; -4.45,1.92 -4.45,3.16 ; -6.3,-4.46 -3.35,-4.46 -3.35,-3.16 -6.3,-3.16 -6.3,-4.46 ; -6.3,-1.92 -3.35,-1.92 -3.35,-0.62 -6.3,-0.62 -6.3,-1.92 ; -6.3,0.62 -3.35,0.62 -3.35,1.92 -6.3,1.92 -6.3,0.62 ; -6.3,3.16 -3.35,3.16 -3.35,4.46 -6.3,4.46 -6.3,3.16 ; -1.35,-3.5 1.35,-3.5 1.35,3.5 -1.35,3.5 -1.35,-3.5
3D body "SW_OMRON_A6DR-4100.stp": height 6.4, standoff -3.41, extent -6.3,-6.1 4.45,6.1